# Altium footprint library connectors.PcbLib: 256 footprints (part 8 of 16)
Each footprint in its own frame and in the unit in brackets; x right, y up, seen from the top. Pads: shape width x height; smd on the part's side, far side on the other; paste and mask are expansions set on the pad; w line width, h text height; cw(c..) or ccw(c..) is an arc to the next point about the centre after c.
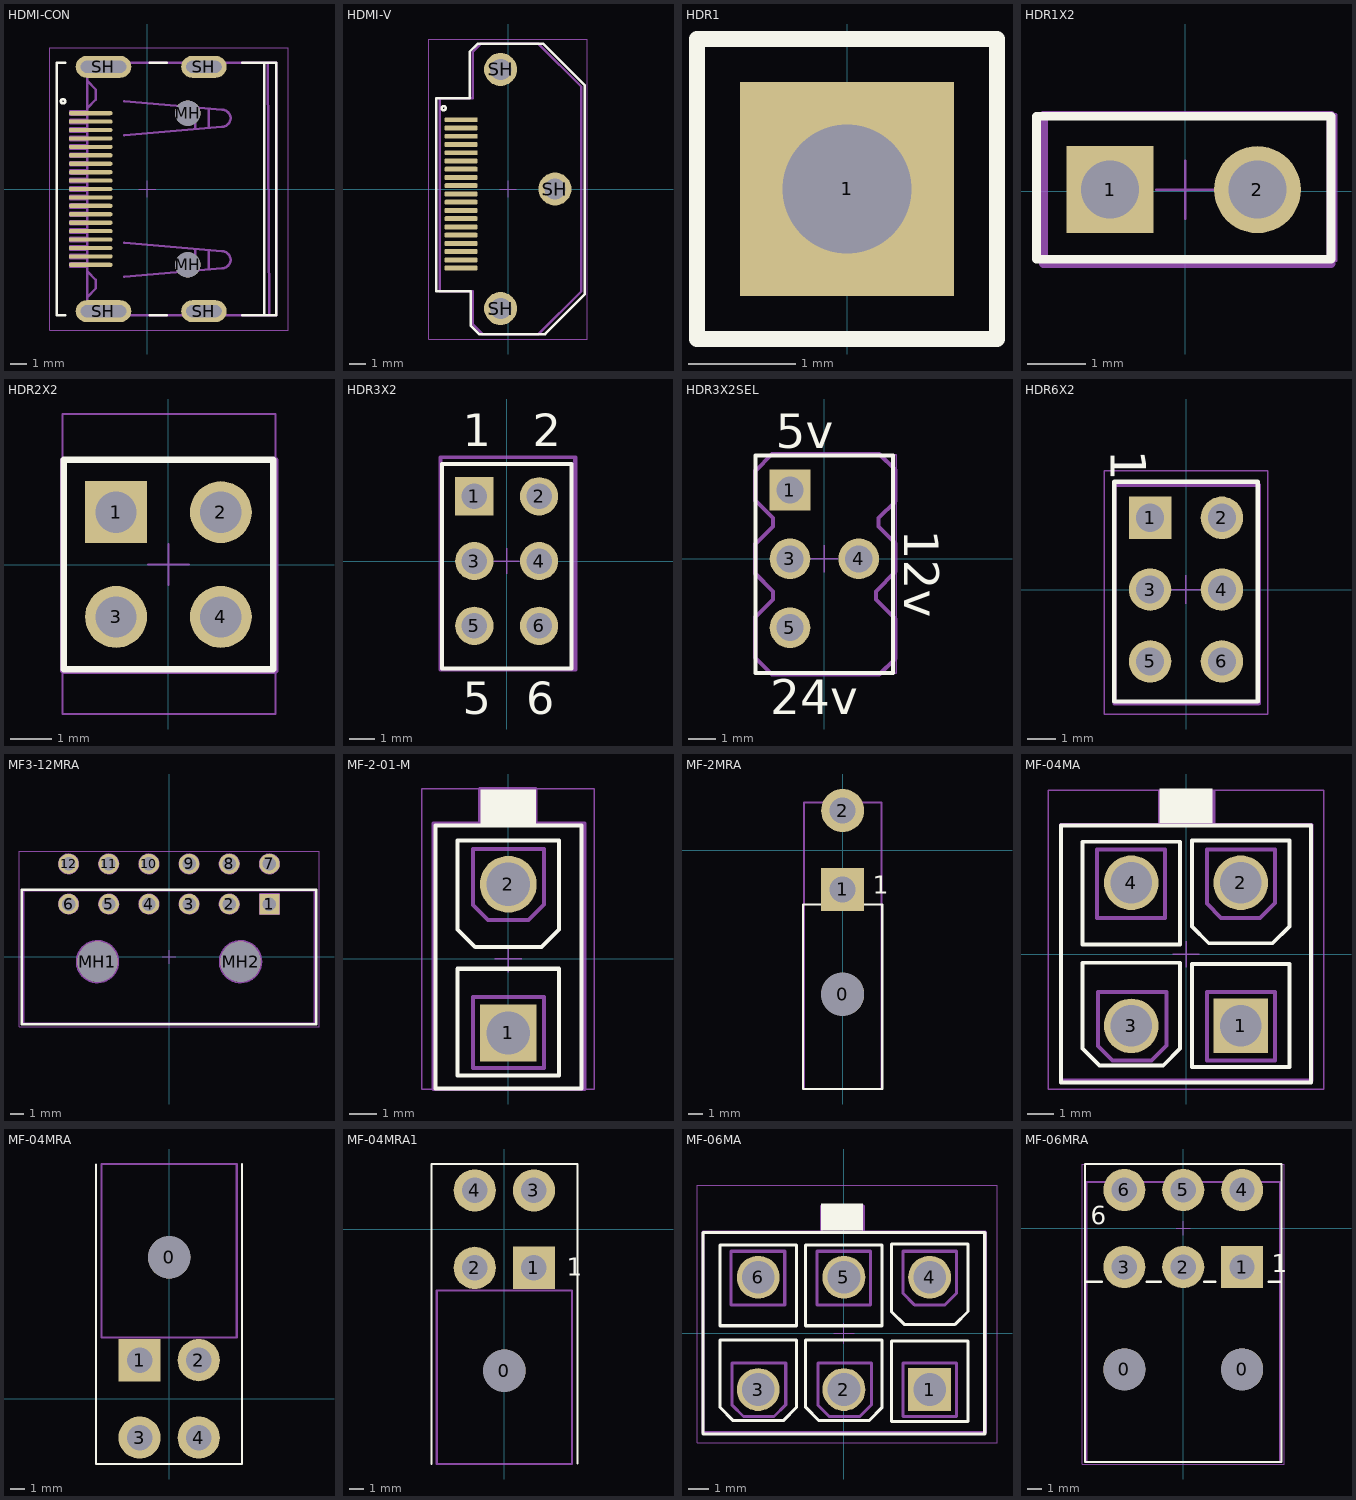
[diagram p7: the footprints below, top view; thin cyan lines are the x and y axes]

## HDMI-CON [mm]
pads (25):
  oval 2.6x0.25 smd mask+0.075: 1(-3.36,4.5) 2(-3.36,4) 3(-3.36,3.5) 4(-3.36,3) 5(-3.36,2.5) 6(-3.36,2) 7(-3.36,1.5) 8(-3.36,1) 9(-3.36,0.5) 10(-3.36,0) 11(-3.36,-0.5) 12(-3.36,-1) 13(-3.36,-1.5) 14(-3.36,-2) 15(-3.36,-2.5) 16(-3.36,-3) 17(-3.36,-3.5) 18(-3.36,-4) 19(-3.36,-4.5)
  round 1.5 hole 1.5 unplated mask+0.15: MH(2.4,-4.5) MH(2.4,4.5)
  oval 3.3x1.3 hole 0.7 slot 2.7 at 0 deg: SH(-2.6,-7.25) SH(-2.6,7.25)
  oval 2.7x1.3 hole 0.7 slot 2.1 at 0 deg: SH(3.36,-7.25) SH(3.36,7.25)
Top Overlay:
  circle w0.15: c-5,5.2 r0.125
  lines w0.15: -4.86,-7.5 -5.36,-7.5 -5.36,7.5 -4.86,7.5 ; 0.14,-7.5 1.14,-7.5 ; 0.14,7.5 1.14,7.5 ; 5.64,-7.5 7.64,-7.5 7.64,7.5 5.64,7.5 ; 6.94,-7.5 6.94,7.5
TopAssy 13:
  lines w0.15: -3.56,-4.6 -4.56,-4.6 -4.56,-4.4 -3.56,-4.4 ; -3.56,-4.1 -4.56,-4.1 -4.56,-3.9 -3.56,-3.9 ; -3.56,-3.6 -4.56,-3.6 -4.56,-3.4 -3.56,-3.4 ; -3.56,-3.1 -4.56,-3.1 -4.56,-2.9 -3.56,-2.9 ; -3.56,-2.6 -4.56,-2.6 -4.56,-2.4 -3.56,-2.4 ; -3.56,-2.1 -4.56,-2.1 -4.56,-1.9 -3.56,-1.9 ; -3.56,-1.6 -4.56,-1.6 -4.56,-1.4 -3.56,-1.4 ; -3.56,-1.1 -4.56,-1.1 -4.56,-0.9 -3.56,-0.9 ; -3.56,-0.6 -4.56,-0.6 -4.56,-0.4 -3.56,-0.4 ; -3.56,-0.1 -4.56,-0.1 -4.56,0.1 -3.56,0.1 ; -3.56,0.4 -4.56,0.4 -4.56,0.6 -3.56,0.6 ; -3.56,0.9 -4.56,0.9 -4.56,1.1 -3.56,1.1 ; -3.56,1.4 -4.56,1.4 -4.56,1.6 -3.56,1.6 ; -3.56,1.9 -4.56,1.9 -4.56,2.1 -3.56,2.1 ; -3.56,2.4 -4.56,2.4 -4.56,2.6 -3.56,2.6 ; -3.56,2.9 -4.56,2.9 -4.56,3.1 -3.56,3.1 ; -3.56,3.4 -4.56,3.4 -4.56,3.6 -3.56,3.6 ; -3.56,3.9 -4.56,3.9 -4.56,4.1 -3.56,4.1 ; -3.56,4.4 -4.56,4.4 -4.56,4.6 -3.56,4.6 ; -3.56,6.8 -3.56,4.8 ; -3.46,-7.2 -1.56,-7.2 -1.56,-7.5 ; -3.46,7.2 -1.56,7.2 -1.56,7.5 ; -1.36,-5.2 4.44,-4.7 ccw(c4.44,-4.2) 4.44,-3.7 -1.36,-3.2 ; -1.36,3.2 4.44,3.7 ccw(c4.44,4.2) 4.44,4.7 -1.36,5.2 ; 2.54,-7.5 2.54,-7.2 4.14,-7.2 4.14,-7.5 ; 2.54,7.5 2.54,7.2 4.14,7.2 4.14,7.5 ; 2.84,-4.838 2.84,-3.562 ; 2.84,3.562 2.84,4.838 ; 3.64,-4.769 3.64,-3.631 ; 3.64,3.631 3.64,4.769 ; 7.14,7.5 7.24,-7.5 ; -3.56,-6.4 -3.06,-5.9 -3.06,-5.4 -3.56,-4.9 ; -3.56,-6.4 -3.56,-7.5 7.64,-7.5 7.64,7.5 -3.56,7.5 -3.56,6.4 -3.06,5.9 -3.06,5.3 -3.56,4.8 ; -3.56,-6.4 -3.56,-4.9 ; -3.56,-4.9 -3.56,4.8
TopCourt 15:
  lines w0.05: -0.5,0 0.5,0 ; 0,-0.475 0,0.475 ; -5.8,-8.375 -5.8,8.375 8.375,8.375 8.375,-8.375 -5.8,-8.375
3D body "471510001.stp": height 6.18, standoff -2.2, extent -4.11,-7.5 8.04,7.5

## HDMI-V [mm]
height 8.5
pads (22):
  rrect50% 2x0.3 smd mask+0.05: 1(-2.85,4.2) 2(-2.85,3.7) 3(-2.85,3.2) 4(-2.85,2.7) 5(-2.85,2.2) 6(-2.85,1.7) 7(-2.85,1.2) 8(-2.85,0.7) 9(-2.85,0.2) 10(-2.85,-0.3) 11(-2.85,-0.8) 12(-2.85,-1.3) 13(-2.85,-1.8) 14(-2.85,-2.3) 15(-2.85,-2.8) 16(-2.85,-3.3) 17(-2.85,-3.8) 18(-2.85,-4.3) 19(-2.85,-4.8)
  round 2 hole 1.3: SH(-0.45,-7.25) SH(-0.45,7.25) SH(2.85,0)
Top Overlay:
  circle w0.15: c-3.9,4.9 r0.125
  lines w0.15: -4.35,-6.2 -2.25,-6.2 -2.25,-8.3 -1.75,-8.8 2.25,-8.8 4.65,-6.4 4.65,6.3 2.15,8.8 -1.85,8.8 -2.325,8.325 -2.325,5.5 -4.35,5.5 -4.35,-6.2
TopAssy 13:
  lines w0.15: -4.15,-6.2 -2.15,-6.2 -2.15,-8.2 -1.55,-8.8 1.85,-8.8 4.45,-6.2 4.45,6.2 1.85,8.8 -1.65,8.8 -2.15,8.3 -2.15,5.5 -4.15,5.5 -4.15,-6.2
TopCourt 15:
  lines w0.05: -0.5,0 0.5,0 ; 0,-0.5 0,0.5 ; -4.8,-9.1 4.8,-9.1 4.8,9.1 -4.8,9.1 -4.8,-9.1
3D body "476591000.stp": height 9.51, standoff -2.99, extent -3.295,-8.75 4.25,8.75

## HDR1 [mm] "Connector; Header; 1 Position"
pads (1):
  rect 2x2 hole 1.2: 1(0,2.5)
Top Overlay:
  lines w0.15: -1.4,1.1 1.4,1.1 1.4,3.9 -1.4,3.9 -1.4,1.1

## HDR1X2 [mm] "Connector; Header; 1x2 Position"
pads (2):
  rect 1.5x1.5 hole 1: 1(-1.295,0.025)
  round 1.5 hole 1: 2(1.245,0.025)
Top Overlay:
  lines w0.15: -2.565,-1.175 2.515,-1.175 2.515,1.295 -2.565,1.295 -2.565,-1.175
TopAssy 13:
  lines w0.15: -2.445,-1.25 2.515,-1.25 2.515,1.312 -2.445,1.312 -2.445,-1.25 ; -1.745,-0.344 -0.945,-0.344 -0.945,0.431 -1.745,0.431 -1.745,-0.344
TopCourt 15:
  lines w0.05: -0.5,0.025 0.5,0.025 ; 0,-0.475 0,0.525 ; -2.575,-1.2 2.6,-1.2 2.6,1.325 -2.575,1.325 -2.575,-1.2
3D body "User Library-PLD-2.step": height 8.55, standoff -2.95, extent -2.495,-1.215 2.505,1.325

## HDR2X2 [mm] "Connector; Header; 2x2 Position"
pads (4):
  rect 1.5x1.5 hole 1: 1(-1.27,1.27)
  round 1.5 hole 1: 2(1.27,1.27) 3(-1.27,-1.27) 4(1.27,-1.27)
Top Overlay:
  lines w0.15: -2.54,-2.54 2.54,-2.54 2.54,2.54 -2.54,2.54 -2.54,-2.54
Bottom3D 2:
  text "1" at -1.778,3.302 h1.27
  text "2" at 0.762,3.81 h1.27
  text "4" at 0.762,-2.794 h1.27
  text "3" at -1.778,-2.794 h1.27
TopAssy 13:
  lines w0.15: -2.55,-2.575 -2.55,2.532 2.59,2.532 2.59,-2.575 -2.55,-2.575 ; -1.67,0.876 -1.67,1.651 -0.87,1.651 -0.87,0.876 -1.67,0.876
TopCourt 15:
  lines w0.05: -0.5,0 0.5,0 ; 0,-0.5 0,0.5 ; -2.575,-3.625 -2.575,3.65 2.6,3.65 2.6,-3.625 -2.575,-3.625
3D body "User Library-PLD-4.step": height 8.5, standoff -3, extent -2.47,-2.47 2.53,2.61

## HDR3X2 [mm] "Connector; Header; 3x2 Position"
pads (6):
  rect 1.5x1.5 hole 1: 1(-1.27,2.54)
  round 1.5 hole 1: 2(1.27,2.54) 3(-1.27,0) 4(1.27,0) 5(-1.27,-2.54) 6(1.27,-2.54)
Top Overlay:
  lines w0.15: -2.54,-4.21 2.54,-4.21 2.54,3.81 -2.54,3.81 -2.54,-4.21
  text "2" at 1.02,4.5 h1.27
  text "1" at -1.73,4.5 h1.27
  text "5" at -1.73,-6 h1.27
  text "6" at 0.77,-6 h1.27
TopAssy 13:
  lines w0.15: -2.6,-4.25 -2.6,4.075 2.7,4.075 2.7,-4.25 -2.6,-4.25 ; -1.694,2.15 -0.919,2.15 -0.919,2.95 -1.694,2.95 -1.694,2.15
TopCourt 15:
  lines w0.05: -0.5,0 0.5,0 ; 0,-0.5 0,0.5 ; -2.6,-4.25 2.625,-4.25 2.625,4.05 -2.6,4.05 -2.6,-4.25
3D body "User Library-PLD-6.step": height 8.5, standoff -3, extent -2.48,-3.79 2.52,3.83

## HDR3X2SEL [mm] "Connector; Header; 3x2 Position"
pads (4):
  rect 1.5x1.5 hole 1: 1(-1.27,2.54)
  round 1.5 hole 1: 3(-1.27,0) 4(1.27,0) 5(-1.27,-2.54)
Top Overlay:
  lines w0.15: -2.54,-4.21 -2.54,3.81 2.54,3.81 2.54,-4.21 -2.54,-4.21
  text "5v" at -1.8,4.075 h1.27
  text "12v" at 2.95,1.075 h1.27
  text "24v" at -2,-5.725 h1.27
TopAssy 13:
  lines w0.15: -2.55,-3.65 -2.55,-2.15 -1.9,-1.5 -1.9,-1.2 -2.55,-0.55 -2.55,0.55 -1.9,1.2 -1.9,1.5 -2.55,2.15 -2.55,3.25 -1.925,3.875 2.025,3.875 2.625,3.275 2.625,2.125 2,1.5 2,1.2 2.625,0.575 2.625,-0.475 1.9,-1.2 1.9,-1.5 2.625,-2.225 2.625,-3.675 2.025,-4.275 -1.925,-4.275 -2.55,-3.65 ; -1.5,-2.78 -1.5,-2.28 -1,-2.28 -1,-2.78 -1.5,-2.78 ; -1.5,-0.24 -1.5,0.26 -1,0.26 -1,-0.24 -1.5,-0.24 ; -1.5,2.3 -1,2.3 -1,2.8 -1.5,2.8 -1.5,2.3 ; 1.04,-0.24 1.04,0.26 1.54,0.26 1.54,-0.24 1.04,-0.24
TopCourt 15:
  lines w0.05: -0.5,0 0.5,0 ; 0,-0.5 0,0.5 ; -2.55,-4.225 -2.55,3.85 2.65,3.85 2.65,-4.225 -2.55,-4.225
3D body "User Library-PLD-6 (1).step": height 8.5, standoff -3, extent -2.475,-3.905 2.525,3.715

## HDR6X2 [mm] "Connector; Header; 6x2 Position"
pads (6):
  rect 1.5x1.5 hole 1: 1(-1.27,2.54)
  round 1.5 hole 1: 2(1.27,2.54) 3(-1.27,0) 4(1.27,0) 5(-1.27,-2.54) 6(1.27,-2.54)
Top Overlay:
  lines w0.15: -2.54,-3.96 -2.54,3.81 2.54,3.81 2.54,-3.96 -2.54,-3.96
  text "1" at -2.67,4.94 h1.27
TopAssy 13:
  lines w0.15: -2.525,-4.025 -2.525,3.7 2.575,3.7 2.575,-4.025 -2.525,-4.025 ; -1.619,2.2 -0.844,2.2 -0.844,3 -1.619,3 -1.619,2.2
TopCourt 15:
  lines w0.05: -0.5,0 0.5,0 ; 0,-0.5 0,0.5 ; -2.9,-4.4 -2.9,4.2 2.9,4.2 2.9,-4.4 -2.9,-4.4
3D body "User Library-PLD-6.step": height 8.5, standoff -3, extent -2.5,-3.88 2.5,3.74

## MF3-12MRA [mm] "Dual row Right angle header With plastic peg 12p"
height 8.76
pads (14):
  rect 1.52x1.52 hole 1: 1(7.5,3.95)
  round 1.52 hole 1: 2(4.5,3.95) 3(1.5,3.95) 4(-1.5,3.95) 5(-4.5,3.95) 6(-7.5,3.95) 7(7.5,6.95) 8(4.5,6.95) 9(1.5,6.95) 10(-1.5,6.95) 11(-4.5,6.95) 12(-7.5,6.95)
  round 3 hole 3 unplated: MH1(-5.34,-0.35) MH2(5.34,-0.35)
Top Overlay:
  lines w0.2: -11,-5.025 11,-5.025 11,5.025 -11,5.025 -11,-5.025
TopAssy 13:
  circle w0.15: c4.5,3.95 r0.716
  circle w0.15: c1.5,3.95 r0.716
  circle w0.15: c-1.5,3.95 r0.716
  circle w0.15: c-4.5,3.95 r0.716
  circle w0.15: c-7.5,3.95 r0.716
  circle w0.15: c7.5,6.95 r0.716
  circle w0.15: c4.5,6.95 r0.716
  circle w0.15: c1.5,6.95 r0.716
  circle w0.15: c-1.5,6.95 r0.716
  circle w0.15: c-4.5,6.95 r0.716
  circle w0.15: c5.34,-0.35 r1.55
  circle w0.15: c-7.5,6.95 r0.716
  circle w0.15: c-5.34,-0.35 r1.55
  lines w0.1: -10.85,-4.95 -10.85,4.95 10.85,4.95 10.85,-4.95 -10.85,-4.95
  lines w0.15: 6.8,3.2 6.8,4.7 8.2,4.7 8.2,3.2 6.8,3.2
TopCourt 15:
  lines w0.05: -0.5,0 0.5,0 ; 0,-0.5 0,0.5 ; -11.2,-5.225 11.2,-5.225 11.2,7.91 -11.2,7.91 -11.2,-5.225
3D body "62001221022.stp": height 8.79, standoff -3.17, extent -10.85,-4.95 10.85,7.27

## MF-2-01-M [mm] "Разъем двухрядный с шагом 4.2мм, вилка"
height 12.8
pads (2):
  rect 2.1x2.1 hole 1.6: 1(0,-2.75)
  round 2.1 hole 1.6: 2(0,2.75)
Top Overlay:
  region: -1.016,4.95 -1.016,6.25 1.016,6.25 1.016,4.95
  lines w0.15: -2.7,-4.8 2.7,-4.8 2.7,4.925 -2.7,4.925 -2.7,-4.8 ; -1.875,-4.325 -1.875,-0.375 1.875,-0.375 1.875,-4.325 -1.875,-4.325 ; -1.875,1.075 -1.875,4.375 1.875,4.375 1.875,1.075 1.225,0.425 -1.225,0.425 -1.875,1.075
TopAssy 13:
  lines w0.15: -1.05,5.025 -1.05,6.275 1,6.275 1,5 ; -2.775,-4.825 2.825,-4.825 2.825,5 -2.775,5 -2.775,-4.825 ; -1.3,-4.05 1.325,-4.05 1.325,-1.425 -1.3,-1.425 -1.3,-4.05 ; -1.3,1.975 -0.75,1.425 0.75,1.425 1.325,2 1.325,4.05 -1.3,4.05 -1.3,1.975
TopCourt 15:
  lines w0.05: -0.5,0 0.5,0 ; 0,-0.5 0,0.5 ; -3.2,-4.825 -3.2,6.275 3.175,6.275 3.175,-4.825 -3.2,-4.825
3D body "Mini-Fit_2.stp": height 12.8, standoff -3.5, extent -3.1,-4.783 3.1,6.217

## MF-2MRA [mm] "Dual row Right angle header 02p"
height 10
pads (3):
  round 3 hole 3 unplated: 0(0,-10.05)
  rect 3x3 hole 1.8: 1(0,-2.75)
  round 3 hole 1.8: 2(0,2.75)
Top Overlay:
  lines w0.15: -2.763,-4.5 -2.763,-16.65 ; -1.47,-3.8 -2.763,-3.8 -2.763,-16.65 ; 1.47,-3.8 2.763,-3.8 2.763,-16.65 ; 2.763,-4.5 2.763,-16.65 ; -2.763,-16.65 2.763,-16.65 ; -2.763,-16.65 2.763,-16.65
  text "1" at 2.1,-3.05 h1.27
TopAssy 13:
  lines w0.15: -2.7,-16.65 2.7,-16.65 2.7,3.32 -2.7,3.32 -2.7,-16.65
3D body "64900229522.stp": height 11.36, standoff -3.59, extent -2.7,-16.65 2.7,3.32

## MF-04MA [mm] "Разъем двухрядный с шагом 4.2мм, вилка"
height 12.8
pads (4):
  rect 2.1x2.1 hole 1.6: 1(2.1,-2.75)
  round 2.1 hole 1.6: 2(2.1,2.75) 3(-2.1,-2.75) 4(-2.1,2.75)
Top Overlay:
  region: -1.016,5.05 -1.016,6.35 1.016,6.35 1.016,5.05
  lines w0.15: -4.8,-4.925 4.8,-4.925 4.8,4.95 -4.8,4.95 -4.8,-4.925 ; -3.975,-3.625 -3.325,-4.275 -0.875,-4.275 -0.225,-3.625 -0.225,-0.325 -3.975,-0.325 -3.975,-3.625 ; -3.975,0.375 -3.975,4.325 -0.225,4.325 -0.225,0.375 -3.975,0.375 ; 0.225,-4.325 0.225,-0.375 3.975,-0.375 3.975,-4.325 0.225,-4.325 ; 0.225,1.075 0.225,4.375 3.975,4.375 3.975,1.075 3.325,0.425 0.875,0.425 0.225,1.075
TopAssy 13:
  lines w0.15: -1,5 -1,6.25 1.05,6.25 1.05,4.975 ; -4.8,-4.85 4.825,-4.85 4.825,4.975 -4.8,4.975 -4.8,-4.85 ; -3.425,1.4 -3.425,4.025 -0.8,4.025 -0.8,1.4 -3.425,1.4 ; -3.375,-3.525 -3.375,-1.45 -0.75,-1.45 -0.75,-3.5 -1.325,-4.075 -2.825,-4.075 -3.375,-3.525 ; 0.8,-4.075 3.425,-4.075 3.425,-1.45 0.8,-1.45 0.8,-4.075 ; 0.8,1.95 1.35,1.4 2.85,1.4 3.425,1.975 3.425,4.025 0.8,4.025 0.8,1.95
TopCourt 15:
  lines w0.05: -0.5,0 0.5,0 ; 0,-0.5 0,0.5 ; -5.3,-5.175 -5.3,6.3 5.3,6.3 5.3,-5.175 -5.3,-5.175
3D body "MF-04MA.stp": height 12.8, standoff -3.5, extent -5.2,-5 5.2,6

## MF-04MRA [mm] "Molex Mini-Fit MF-4MRA 39301040, 4.2mm"
pads (5):
  round 3 hole 3 unplated: 0(0,10.05)
  rect 3x3 hole 1.8: 1(-2.1,2.75)
  round 3 hole 1.8: 2(2.1,2.75) 3(-2.1,-2.75) 4(2.1,-2.75)
Top Overlay:
  lines w0.15: -5.2,16.65 -5.2,-4.625 5.175,-4.625 5.175,16.675
TopAssy 13:
  lines w0.15: -4.8,4.35 -4.8,16.675 4.8,16.675 4.8,4.35 -4.8,4.35
3D body "039301040.stp": height 11.4, standoff -3.6, extent -5.2,-3.31 4.8,16.625

## MF-04MRA1 [mm] "Molex Mini-Fit MF-4MRA 39301040, 4.2mm"
pads (5):
  round 3 hole 3 unplated: 0(0,-10.05)
  rect 3x3 hole 1.8: 1(2.1,-2.75)
  round 3 hole 1.8: 2(-2.1,-2.75) 3(2.1,2.75) 4(-2.1,2.75)
Top Overlay:
  lines w0.15: -5.175,-16.675 -5.175,4.625 5.2,4.625 5.2,-16.65
  text "1" at 4.425,-3.3 h1.27
TopAssy 13:
  lines w0.15: -4.8,-16.675 4.8,-16.675 4.8,-4.35 -4.8,-4.35 -4.8,-16.675
3D body "039301040.stp": height 11.4, standoff -3.6, extent -4.8,-16.625 5.2,3.31

## MF-06MA [mm] "Разъем двухрядный с шагом 4.2мм, вилка"
height 12.8
pads (6):
  rect 2.1x2.1 hole 1.6: 1(4.2,-2.75)
  round 2.1 hole 1.6: 2(0,-2.75) 3(-4.2,-2.75) 4(4.2,2.75) 5(0,2.75) 6(-4.2,2.75)
Top Overlay:
  region: -1.116,5.05 -1.116,6.35 0.916,6.35 0.916,5.05
  lines w0.15: -6.9,-4.925 6.9,-4.925 6.9,4.95 -6.9,4.95 -6.9,-4.925 ; -6.075,-3.625 -6.075,-0.325 -2.325,-0.325 -2.325,-3.625 -2.975,-4.275 -5.425,-4.275 -6.075,-3.625 ; -6.075,0.375 -2.325,0.375 -2.325,4.325 -6.075,4.325 -6.075,0.375 ; -1.875,-3.625 -1.225,-4.275 1.225,-4.275 1.875,-3.625 1.875,-0.325 -1.875,-0.325 -1.875,-3.625 ; -1.875,0.375 -1.875,4.325 1.875,4.325 1.875,0.375 -1.875,0.375 ; 2.325,-4.325 2.325,-0.375 6.075,-0.375 6.075,-4.325 2.325,-4.325 ; 2.325,1.075 2.325,4.375 6.075,4.375 6.075,1.075 5.425,0.425 2.975,0.425 2.325,1.075
TopAssy 13:
  lines w0.15: -1.1,5 -1.1,6.25 0.95,6.25 0.95,4.975 ; -6.9,-4.85 6.925,-4.85 6.925,4.975 -6.9,4.975 -6.9,-4.85 ; -5.525,1.4 -2.9,1.4 -2.9,4.025 -5.525,4.025 -5.525,1.4 ; -5.475,-3.525 -4.925,-4.075 -3.425,-4.075 -2.85,-3.5 -2.85,-1.45 -5.475,-1.45 -5.475,-3.525 ; -1.325,1.4 -1.325,4.025 1.3,4.025 1.3,1.4 -1.325,1.4 ; -1.275,-3.525 -1.275,-1.45 1.35,-1.45 1.35,-3.5 0.775,-4.075 -0.725,-4.075 -1.275,-3.525 ; 2.9,-4.075 5.525,-4.075 5.525,-1.45 2.9,-1.45 2.9,-4.075 ; 2.9,1.95 3.45,1.4 4.95,1.4 5.525,1.975 5.525,4.025 2.9,4.025 2.9,1.95
TopCourt 15:
  lines w0.05: -0.5,0 0.5,0 ; 0,-0.5 0,0.5 ; -7.2,-5.35 -7.2,7.25 7.5,7.25 7.5,-5.35 -7.2,-5.35
3D body "User Library-Con_MF-06MA.step": height 12.8, standoff -3.5, extent -6.9,-4.85 7.3,6.15

## MF-06MRA [mm] "Dual row Right angle header 06p"
height 10
pads (8):
  round 3 hole 3 unplated: 0(-4.2,-10.05) 0(4.2,-10.05)
  rect 3x3 hole 1.8: 1(4.2,-2.75)
  round 3 hole 1.8: 2(0,-2.75) 3(-4.2,-2.75) 4(4.2,2.75) 5(0,2.75) 6(-4.2,2.75)
Top Overlay:
  lines w0.15: -6.962,-16.65 6.9,-16.65 ; -5.8,-3.8 -7,-3.8 ; -2.6,-3.8 -1.6,-3.8 ; 1.5,-3.8 2.3,-3.8 ; 6.1,-3.8 7,-3.8 ; -7,-3.8 -7,-16.65 7,-16.65 7,4.6 -7,4.6 -7,-3.8
  text "6" at -6.6,0.3 h1.27
  text "1" at 6.325,-3.125 h1.27
TopAssy 13:
  lines w0.15: -6.9,-16.65 6.9,-16.65 6.9,3.32 -6.9,3.32 -6.9,-16.65
TopCourt 15:
  lines w0.05: -0.5,0 0.5,0 ; 0,-0.5 0,0.5 ; -7.2,-16.8 -7.2,4.6 7.2,4.6 7.2,-16.8 -7.2,-16.8
3D body "64900629522.stp": height 11.36, standoff -3.59, extent -6.9,-16.65 6.9,3.32